# Altium schematic symbol library jlcpcb_2025_04_inductors_extended_0603.schlib: 1269 symbols (part 2 of 7)
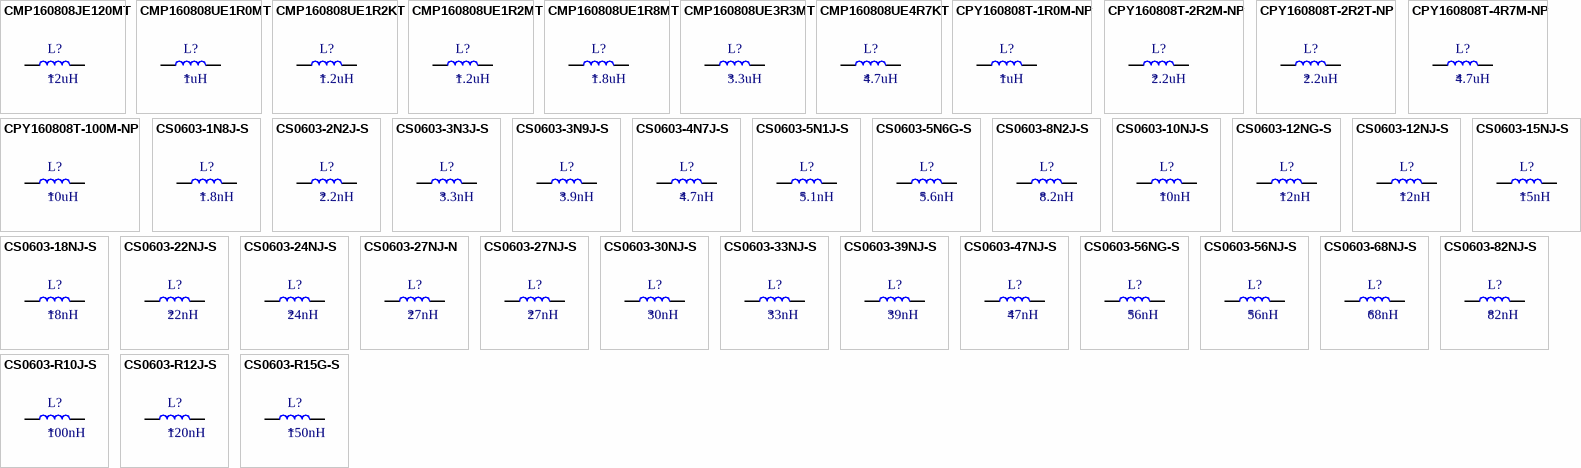
[diagram p32: symbols CMP160808JE120MT to CS0603-R15G-S]

## CS0603-33NJ-S
designator L?  Inductance: 33nH
Inductor, 33nH, ±5%, 220mΩ, 600mA, SMD 0603; Manufacturer: Chilisin Elec; Manufacturer Part Number: CS0603-33NJ-S; Self-Resonant Frequency: 2.3GHz; Q Factor: 40@250MHz; Package Size: 0603; JLCPCB Basic Part: No; JLCPCB Part Number: C280270; Supplier 1: LCSC; Category: Inductors; Supplier Part Number 1: C280270; Tolerance: ±5%; Rated Current: 600mA; DC Resistance: 220mΩ; RoHS: Yes; ComponentLink1Description: Datasheet; ComponentLink1URL: https://wmsc.lcsc.com/wmsc/upload/file/pdf/v2/lcsc/2304140030_Chilisin-Elec-CS0603-33NJ-S_C280270.pdf; ComponentLink2Description: JLCPCB Part URL; ComponentLink2URL: https://jlcpcb.com/partdetail/C280270; ComponentLink3Description: LCSC Part URL; ComponentLink3URL: https://lcsc.com/product-detail/Inductors-SMD_Chilisin-Elec-Chilisin-Elec-CS0603-33NJ-S_C280270.html
footprint IND-0603 (0603 (1608M) Inductor)
pins: 1, 2

## CS0603-39NJ-S
designator L?  Inductance: 39nH
Inductor, 39nH, ±5%, 250mΩ, 600mA, SMD 0603; Manufacturer: Chilisin Elec; Manufacturer Part Number: CS0603-39NJ-S; Self-Resonant Frequency: 2.2GHz; Q Factor: 40@250MHz; Package Size: 0603; JLCPCB Basic Part: No; JLCPCB Part Number: C142171; Supplier 1: LCSC; Category: Inductors; Supplier Part Number 1: C142171; Tolerance: ±5%; Rated Current: 600mA; DC Resistance: 250mΩ; RoHS: Yes; ComponentLink1Description: Datasheet; ComponentLink1URL: https://wmsc.lcsc.com/wmsc/upload/file/pdf/v2/lcsc/2304140030_Chilisin-Elec-CS0603-39NJ-S_C142171.pdf; ComponentLink2Description: JLCPCB Part URL; ComponentLink2URL: https://jlcpcb.com/partdetail/C142171; ComponentLink3Description: LCSC Part URL; ComponentLink3URL: https://lcsc.com/product-detail/Inductors-SMD_Chilisin-Elec-Chilisin-Elec-CS0603-39NJ-S_C142171.html
footprint IND-0603 (0603 (1608M) Inductor)
pins: 1, 2

## CS0603-47NJ-S
designator L?  Inductance: 47nH
Inductor, 47nH, ±5%, 280mΩ, 600mA, SMD 0603; Manufacturer: Chilisin Elec; Manufacturer Part Number: CS0603-47NJ-S; Self-Resonant Frequency: 2GHz; Q Factor: 38@200MHz; Package Size: 0603; JLCPCB Basic Part: No; JLCPCB Part Number: C280273; Supplier 1: LCSC; Category: Inductors; Supplier Part Number 1: C280273; Tolerance: ±5%; Rated Current: 600mA; DC Resistance: 280mΩ; RoHS: Yes; ComponentLink1Description: Datasheet; ComponentLink1URL: https://wmsc.lcsc.com/wmsc/upload/file/pdf/v2/lcsc/2304140030_Chilisin-Elec-CS0603-47NJ-S_C280273.pdf; ComponentLink2Description: JLCPCB Part URL; ComponentLink2URL: https://jlcpcb.com/partdetail/C280273; ComponentLink3Description: LCSC Part URL; ComponentLink3URL: https://lcsc.com/product-detail/Inductors-SMD_Chilisin-Elec-Chilisin-Elec-CS0603-47NJ-S_C280273.html
footprint IND-0603 (0603 (1608M) Inductor)
pins: 1, 2

## CS0603-56NG-S
designator L?  Inductance: 56nH
Inductor, 56nH, ±2%, 310mΩ, 600mA, SMD 0603; Manufacturer: Chilisin Elec; Manufacturer Part Number: CS0603-56NG-S; Self-Resonant Frequency: 1.9GHz; Q Factor: 38@200MHz; Package Size: 0603; JLCPCB Basic Part: No; JLCPCB Part Number: C280275; Supplier 1: LCSC; Category: Inductors; Supplier Part Number 1: C280275; Tolerance: ±2%; Rated Current: 600mA; DC Resistance: 310mΩ; RoHS: Yes; ComponentLink1Description: Datasheet; ComponentLink1URL: https://wmsc.lcsc.com/wmsc/upload/file/pdf/v2/lcsc/1810262121_Chilisin-Elec-CS0603-56NG-S_C280275.pdf; ComponentLink2Description: JLCPCB Part URL; ComponentLink2URL: https://jlcpcb.com/partdetail/C280275; ComponentLink3Description: LCSC Part URL; ComponentLink3URL: https://lcsc.com/product-detail/Inductors-SMD_Chilisin-Elec-Chilisin-Elec-CS0603-56NG-S_C280275.html
footprint IND-0603 (0603 (1608M) Inductor)
pins: 1, 2

## CS0603-56NJ-S
designator L?  Inductance: 56nH
Inductor, 56nH, ±5%, 310mΩ, 600mA, SMD 0603; Manufacturer: Chilisin Elec; Manufacturer Part Number: CS0603-56NJ-S; Self-Resonant Frequency: 1.9GHz; Q Factor: 38@200MHz; Package Size: 0603; JLCPCB Basic Part: No; JLCPCB Part Number: C108266; Supplier 1: LCSC; Category: Inductors; Supplier Part Number 1: C108266; Tolerance: ±5%; Rated Current: 600mA; DC Resistance: 310mΩ; RoHS: Yes; ComponentLink1Description: Datasheet; ComponentLink1URL: https://wmsc.lcsc.com/wmsc/upload/file/pdf/v2/lcsc/2304140030_Chilisin-Elec-CS0603-56NJ-S_C108266.pdf; ComponentLink2Description: JLCPCB Part URL; ComponentLink2URL: https://jlcpcb.com/partdetail/C108266; ComponentLink3Description: LCSC Part URL; ComponentLink3URL: https://lcsc.com/product-detail/Inductors-SMD_Chilisin-Elec-Chilisin-Elec-CS0603-56NJ-S_C108266.html
footprint IND-0603 (0603 (1608M) Inductor)
pins: 1, 2

## CS0603-68NJ-S
designator L?  Inductance: 68nH
Inductor, 68nH, ±5%, 340mΩ, 600mA, SMD 0603; Manufacturer: Chilisin Elec; Manufacturer Part Number: CS0603-68NJ-S; Self-Resonant Frequency: 1.7GHz; Q Factor: 37@200MHz; Package Size: 0603; JLCPCB Basic Part: No; JLCPCB Part Number: C142169; Supplier 1: LCSC; Category: Inductors; Supplier Part Number 1: C142169; Tolerance: ±5%; Rated Current: 600mA; DC Resistance: 340mΩ; RoHS: Yes; ComponentLink1Description: Datasheet; ComponentLink1URL: https://wmsc.lcsc.com/wmsc/upload/file/pdf/v2/lcsc/2304140030_Chilisin-Elec-CS0603-68NJ-S_C142169.pdf; ComponentLink2Description: JLCPCB Part URL; ComponentLink2URL: https://jlcpcb.com/partdetail/C142169; ComponentLink3Description: LCSC Part URL; ComponentLink3URL: https://lcsc.com/product-detail/Inductors-SMD_Chilisin-Elec-Chilisin-Elec-CS0603-68NJ-S_C142169.html
footprint IND-0603 (0603 (1608M) Inductor)
pins: 1, 2

## CS0603-82NJ-S
designator L?  Inductance: 82nH
Inductor, 82nH, ±5%, 540mΩ, 400mA, SMD 0603; Manufacturer: Chilisin Elec; Manufacturer Part Number: CS0603-82NJ-S; Self-Resonant Frequency: 1.7GHz; Q Factor: 34@150MHz; Package Size: 0603; JLCPCB Basic Part: No; JLCPCB Part Number: C280278; Supplier 1: LCSC; Category: Inductors; Supplier Part Number 1: C280278; Tolerance: ±5%; Rated Current: 400mA; DC Resistance: 540mΩ; RoHS: Yes; ComponentLink1Description: Datasheet; ComponentLink1URL: https://wmsc.lcsc.com/wmsc/upload/file/pdf/v2/lcsc/2304140030_Chilisin-Elec-CS0603-82NJ-S_C280278.pdf; ComponentLink2Description: JLCPCB Part URL; ComponentLink2URL: https://jlcpcb.com/partdetail/C280278; ComponentLink3Description: LCSC Part URL; ComponentLink3URL: https://lcsc.com/product-detail/Inductors-SMD_Chilisin-Elec-Chilisin-Elec-CS0603-82NJ-S_C280278.html
footprint IND-0603 (0603 (1608M) Inductor)
pins: 1, 2

## CS0603-R10J-S
designator L?  Inductance: 100nH
Inductor, 100nH, ±5%, 580mΩ, 400mA, SMD 0603; Manufacturer: Chilisin Elec; Manufacturer Part Number: CS0603-R10J-S; Self-Resonant Frequency: 1.4GHz; Q Factor: 34@150MHz; Package Size: 0603; JLCPCB Basic Part: No; JLCPCB Part Number: C142168; Supplier 1: LCSC; Category: Inductors; Supplier Part Number 1: C142168; Tolerance: ±5%; Rated Current: 400mA; DC Resistance: 580mΩ; RoHS: Yes; ComponentLink1Description: Datasheet; ComponentLink1URL: https://wmsc.lcsc.com/wmsc/upload/file/pdf/v2/lcsc/2304140030_Chilisin-Elec-CS0603-R10J-S_C142168.pdf; ComponentLink2Description: JLCPCB Part URL; ComponentLink2URL: https://jlcpcb.com/partdetail/C142168; ComponentLink3Description: LCSC Part URL; ComponentLink3URL: https://lcsc.com/product-detail/Inductors-SMD_Chilisin-Elec-Chilisin-Elec-CS0603-R10J-S_C142168.html
footprint IND-0603 (0603 (1608M) Inductor)
pins: 1, 2

## CS0603-R12J-S
designator L?  Inductance: 120nH
Inductor, 120nH, ±5%, 750mΩ, 300mA, SMD 0603; Manufacturer: Chilisin Elec; Manufacturer Part Number: CS0603-R12J-S; Self-Resonant Frequency: 1.3GHz; Q Factor: 32@150MHz; Package Size: 0603; JLCPCB Basic Part: No; JLCPCB Part Number: C280280; Supplier 1: LCSC; Category: Inductors; Supplier Part Number 1: C280280; Tolerance: ±5%; Rated Current: 300mA; DC Resistance: 750mΩ; RoHS: Yes; ComponentLink1Description: Datasheet; ComponentLink1URL: https://wmsc.lcsc.com/wmsc/upload/file/pdf/v2/lcsc/2304140030_Chilisin-Elec-CS0603-R12J-S_C280280.pdf; ComponentLink2Description: JLCPCB Part URL; ComponentLink2URL: https://jlcpcb.com/partdetail/C280280; ComponentLink3Description: LCSC Part URL; ComponentLink3URL: https://lcsc.com/product-detail/Inductors-SMD_Chilisin-Elec-Chilisin-Elec-CS0603-R12J-S_C280280.html
footprint IND-0603 (0603 (1608M) Inductor)
pins: 1, 2

## CS0603-R15G-S
designator L?  Inductance: 150nH
Inductor, 150nH, ±2%, 920mΩ, 280mA, SMD 0603; Manufacturer: Chilisin Elec; Manufacturer Part Number: CS0603-R15G-S; Self-Resonant Frequency: 990MHz; Q Factor: 28@150MHz; Package Size: 0603; JLCPCB Basic Part: No; JLCPCB Part Number: C280281; Supplier 1: LCSC; Category: Inductors; Supplier Part Number 1: C280281; Tolerance: ±2%; Rated Current: 280mA; DC Resistance: 920mΩ; RoHS: Yes; ComponentLink1Description: Datasheet; ComponentLink1URL: https://wmsc.lcsc.com/wmsc/upload/file/pdf/v2/lcsc/1810262121_Chilisin-Elec-CS0603-R15G-S_C280281.pdf; ComponentLink2Description: JLCPCB Part URL; ComponentLink2URL: https://jlcpcb.com/partdetail/C280281; ComponentLink3Description: LCSC Part URL; ComponentLink3URL: https://lcsc.com/product-detail/Inductors-SMD_Chilisin-Elec-Chilisin-Elec-CS0603-R15G-S_C280281.html
footprint IND-0603 (0603 (1608M) Inductor)
pins: 1, 2

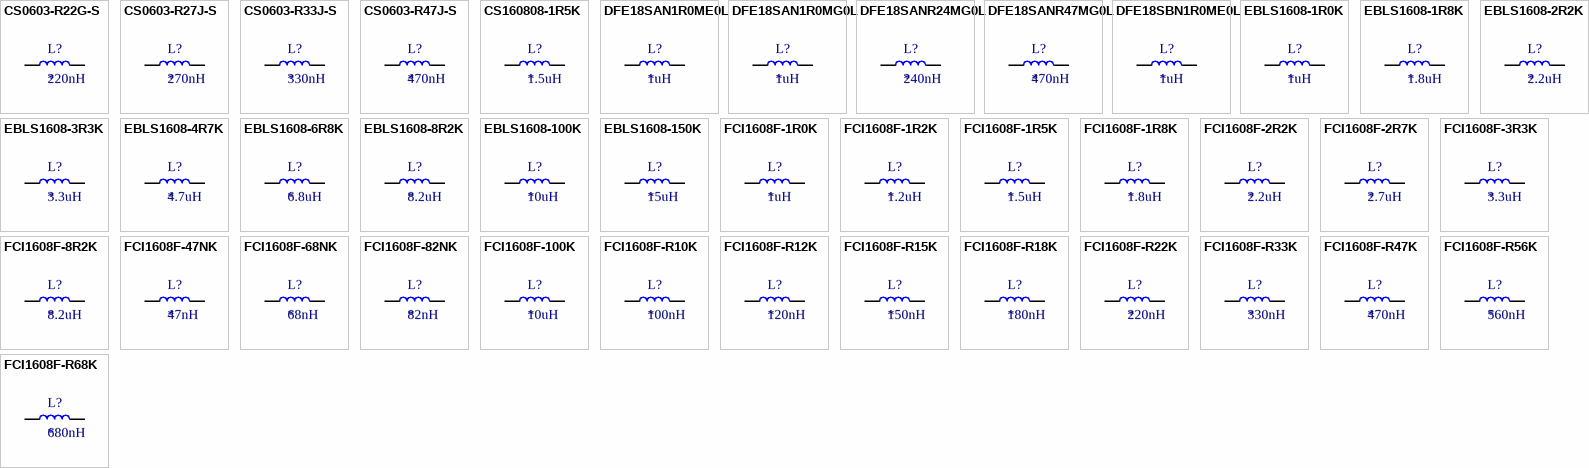
[diagram p5: symbols CS0603-R22G-S to FCI1608F-R68K]

## CS0603-R22G-S
designator L?  Inductance: 220nH
Inductor, 220nH, ±2%, 2.1Ω, 200mA, SMD 0603; Manufacturer: Chilisin Elec; Manufacturer Part Number: CS0603-R22G-S; Self-Resonant Frequency: 900MHz; Q Factor: 25@100MHz; Package Size: 0603; JLCPCB Basic Part: No; JLCPCB Part Number: C280284; Supplier 1: LCSC; Category: Inductors; Supplier Part Number 1: C280284; Tolerance: ±2%; Rated Current: 200mA; DC Resistance: 2.1Ω; RoHS: Yes; ComponentLink1Description: Datasheet; ComponentLink1URL: https://wmsc.lcsc.com/wmsc/upload/file/pdf/v2/lcsc/1810262121_Chilisin-Elec-CS0603-R22G-S_C280284.pdf; ComponentLink2Description: JLCPCB Part URL; ComponentLink2URL: https://jlcpcb.com/partdetail/C280284; ComponentLink3Description: LCSC Part URL; ComponentLink3URL: https://lcsc.com/product-detail/Inductors-SMD_Chilisin-Elec-Chilisin-Elec-CS0603-R22G-S_C280284.html
footprint IND-0603 (0603 (1608M) Inductor)
pins: 1, 2

## CS0603-R27J-S
designator L?  Inductance: 270nH
Inductor, 270nH, ±5%, 2.8Ω, 170mA, SMD 0603; Manufacturer: Chilisin Elec; Manufacturer Part Number: CS0603-R27J-S; Self-Resonant Frequency: 900MHz; Q Factor: 24@100MHz; Package Size: 0603; JLCPCB Basic Part: No; JLCPCB Part Number: C142166; Supplier 1: LCSC; Category: Inductors; Supplier Part Number 1: C142166; Tolerance: ±5%; Rated Current: 170mA; DC Resistance: 2.8Ω; RoHS: Yes; ComponentLink1Description: Datasheet; ComponentLink1URL: https://wmsc.lcsc.com/wmsc/upload/file/pdf/v2/lcsc/2304140030_Chilisin-Elec-CS0603-R27J-S_C142166.pdf; ComponentLink2Description: JLCPCB Part URL; ComponentLink2URL: https://jlcpcb.com/partdetail/C142166; ComponentLink3Description: LCSC Part URL; ComponentLink3URL: https://lcsc.com/product-detail/Inductors-SMD_Chilisin-Elec-Chilisin-Elec-CS0603-R27J-S_C142166.html
footprint IND-0603 (0603 (1608M) Inductor)
pins: 1, 2

## CS0603-R33J-S
designator L?  Inductance: 330nH
Inductor, 330nH, ±5%, 3.89Ω, 100mA, SMD 0603; Manufacturer: Chilisin Elec; Manufacturer Part Number: CS0603-R33J-S; Self-Resonant Frequency: 900MHz; Q Factor: 25@100MHz; Package Size: 0603; JLCPCB Basic Part: No; JLCPCB Part Number: C142165; Supplier 1: LCSC; Category: Inductors; Supplier Part Number 1: C142165; Tolerance: ±5%; Rated Current: 100mA; DC Resistance: 3.89Ω; RoHS: Yes; ComponentLink1Description: Datasheet; ComponentLink1URL: https://wmsc.lcsc.com/wmsc/upload/file/pdf/v2/lcsc/2304140030_Chilisin-Elec-CS0603-R33J-S_C142165.pdf; ComponentLink2Description: JLCPCB Part URL; ComponentLink2URL: https://jlcpcb.com/partdetail/C142165; ComponentLink3Description: LCSC Part URL; ComponentLink3URL: https://lcsc.com/product-detail/Inductors-SMD_Chilisin-Elec-Chilisin-Elec-CS0603-R33J-S_C142165.html
footprint IND-0603 (0603 (1608M) Inductor)
pins: 1, 2

## CS0603-R47J-S
designator L?  Inductance: 470nH
Inductor, 470nH, ±5%, 4.5Ω, 100mA, SMD 0603; Manufacturer: Chilisin Elec; Manufacturer Part Number: CS0603-R47J-S; Self-Resonant Frequency: 500MHz; Q Factor: 25@100MHz; Package Size: 0603; JLCPCB Basic Part: No; JLCPCB Part Number: C280285; Supplier 1: LCSC; Category: Inductors; Supplier Part Number 1: C280285; Tolerance: ±5%; Rated Current: 100mA; DC Resistance: 4.5Ω; RoHS: Yes; ComponentLink1Description: Datasheet; ComponentLink1URL: https://wmsc.lcsc.com/wmsc/upload/file/pdf/v2/lcsc/2304140030_Chilisin-Elec-CS0603-R47J-S_C280285.pdf; ComponentLink2Description: JLCPCB Part URL; ComponentLink2URL: https://jlcpcb.com/partdetail/C280285; ComponentLink3Description: LCSC Part URL; ComponentLink3URL: https://lcsc.com/product-detail/Inductors-SMD_Chilisin-Elec-Chilisin-Elec-CS0603-R47J-S_C280285.html
footprint IND-0603 (0603 (1608M) Inductor)
pins: 1, 2

## CS160808-1R5K
designator L?  Inductance: 1.5uH
Inductor, 1.5uH, ±10%, 650mΩ, 50mA, SMD 0603; Manufacturer: BOURNS; Manufacturer Part Number: CS160808-1R5K; Self-Resonant Frequency: 55MHz; Q Factor: 50@10MHz; Package Size: 0603; JLCPCB Basic Part: No; JLCPCB Part Number: C2052402; Supplier 1: LCSC; Category: Inductors; Supplier Part Number 1: C2052402; Tolerance: ±10%; Rated Current: 50mA; DC Resistance: 650mΩ; RoHS: Yes; ComponentLink1Description: Datasheet; ComponentLink1URL: https://wmsc.lcsc.com/wmsc/upload/file/pdf/v2/lcsc/2202010700_BOURNS-CS160808-1R5K_C2052402.pdf; ComponentLink2Description: JLCPCB Part URL; ComponentLink2URL: https://jlcpcb.com/partdetail/C2052402; ComponentLink3Description: LCSC Part URL; ComponentLink3URL: https://lcsc.com/product-detail/Inductors-SMD_BOURNS-BOURNS-CS160808-1R5K_C2052402.html
footprint IND-0603 (0603 (1608M) Inductor)
pins: 1, 2

## DFE18SAN1R0ME0L
designator L?  Inductance: 1uH
Inductor, 1uH, ±20%, 144mΩ, 1.6A, SMD 0603; Manufacturer: Murata Electronics; Manufacturer Part Number: DFE18SAN1R0ME0L; Package Size: 0603; JLCPCB Basic Part: No; JLCPCB Part Number: C2044564; Supplier 1: LCSC; Category: Inductors; Supplier Part Number 1: C2044564; Tolerance: ±20%; Rated Current: 1.6A; DC Resistance: 144mΩ; RoHS: Yes; ComponentLink1Description: Datasheet; ComponentLink1URL: https://wmsc.lcsc.com/wmsc/upload/file/pdf/v2/lcsc/2304140030_Murata-Electronics-DFE18SAN1R0ME0L_C2044564.pdf; ComponentLink2Description: JLCPCB Part URL; ComponentLink2URL: https://jlcpcb.com/partdetail/C2044564; ComponentLink3Description: LCSC Part URL; ComponentLink3URL: https://lcsc.com/product-detail/Inductors-SMD_Murata-Electronics-Murata-Electronics-DFE18SAN1R0ME0L_C2044564.html
footprint IND-0603 (0603 (1608M) Inductor)
pins: 1, 2

## DFE18SAN1R0MG0L
designator L?  Inductance: 1uH
Inductor, 1uH, ±20%, 128mΩ, 1.7A, SMD 0603; Manufacturer: Murata Electronics; Manufacturer Part Number: DFE18SAN1R0MG0L; Saturation Current: 2.1A; Package Size: 0603; JLCPCB Basic Part: No; JLCPCB Part Number: C560043; Supplier 1: LCSC; Category: Inductors; Supplier Part Number 1: C560043; Tolerance: ±20%; Rated Current: 1.7A; DC Resistance: 128mΩ; RoHS: Yes; ComponentLink1Description: Datasheet; ComponentLink1URL: https://wmsc.lcsc.com/wmsc/upload/file/pdf/v2/lcsc/2304140030_Murata-Electronics-DFE18SAN1R0MG0L_C560043.pdf; ComponentLink2Description: JLCPCB Part URL; ComponentLink2URL: https://jlcpcb.com/partdetail/C560043; ComponentLink3Description: LCSC Part URL; ComponentLink3URL: https://lcsc.com/product-detail/Inductors-SMD_Murata-Electronics-Murata-Electronics-DFE18SAN1R0MG0L_C560043.html
footprint IND-0603 (0603 (1608M) Inductor)
pins: 1, 2

## DFE18SANR24MG0L
designator L?  Inductance: 240nH
Inductor, 240nH, ±20%, 30mΩ, 3.5A, SMD 0603; Manufacturer: Murata Electronics; Manufacturer Part Number: DFE18SANR24MG0L; Package Size: 0603; JLCPCB Basic Part: No; JLCPCB Part Number: C668512; Supplier 1: LCSC; Category: Inductors; Supplier Part Number 1: C668512; Tolerance: ±20%; Rated Current: 3.5A; DC Resistance: 30mΩ; RoHS: Yes; ComponentLink1Description: Datasheet; ComponentLink1URL: https://wmsc.lcsc.com/wmsc/upload/file/pdf/v2/lcsc/2007241808_Murata-Electronics-DFE18SANR24MG0L_C668512.pdf; ComponentLink2Description: JLCPCB Part URL; ComponentLink2URL: https://jlcpcb.com/partdetail/C668512; ComponentLink3Description: LCSC Part URL; ComponentLink3URL: https://lcsc.com/product-detail/Inductors-SMD_Murata-Electronics-Murata-Electronics-DFE18SANR24MG0L_C668512.html
footprint IND-0603 (0603 (1608M) Inductor)
pins: 1, 2

## DFE18SANR47MG0L
designator L?  Inductance: 470nH
Inductor, 470nH, ±20%, 54mΩ, 2.6A, SMD 0603; Manufacturer: Murata Electronics; Manufacturer Part Number: DFE18SANR47MG0L; Package Size: 0603; JLCPCB Basic Part: No; JLCPCB Part Number: C882988; Supplier 1: LCSC; Category: Inductors; Supplier Part Number 1: C882988; Tolerance: ±20%; Rated Current: 2.6A; DC Resistance: 54mΩ; RoHS: Yes; ComponentLink1Description: Datasheet; ComponentLink1URL: https://wmsc.lcsc.com/wmsc/upload/file/pdf/v2/lcsc/2201242130_Murata-Electronics-DFE18SANR47MG0L_C882988.pdf; ComponentLink2Description: JLCPCB Part URL; ComponentLink2URL: https://jlcpcb.com/partdetail/C882988; ComponentLink3Description: LCSC Part URL; ComponentLink3URL: https://lcsc.com/product-detail/Inductors-SMD_Murata-Electronics-Murata-Electronics-DFE18SANR47MG0L_C882988.html
footprint IND-0603 (0603 (1608M) Inductor)
pins: 1, 2

## DFE18SBN1R0ME0L
designator L?  Inductance: 1uH
Inductor, 1uH, ±20%, 120mΩ, 1.8A, SMD 0603; Manufacturer: Murata Electronics; Manufacturer Part Number: DFE18SBN1R0ME0L; Saturation Current: 1.9A; Package Size: 0603; JLCPCB Basic Part: No; JLCPCB Part Number: C882989; Supplier 1: LCSC; Category: Inductors; Supplier Part Number 1: C882989; Tolerance: ±20%; Rated Current: 1.8A; DC Resistance: 120mΩ; RoHS: Yes; ComponentLink1Description: Datasheet; ComponentLink1URL: https://wmsc.lcsc.com/wmsc/upload/file/pdf/v2/lcsc/2011111205_Murata-Electronics-DFE18SBN1R0ME0L_C882989.pdf; ComponentLink2Description: JLCPCB Part URL; ComponentLink2URL: https://jlcpcb.com/partdetail/C882989; ComponentLink3Description: LCSC Part URL; ComponentLink3URL: https://lcsc.com/product-detail/Power-Inductors_Murata-Electronics-Murata-Electronics-DFE18SBN1R0ME0L_C882989.html
footprint IND-0603 (0603 (1608M) Inductor)
pins: 1, 2

## EBLS1608-1R0K
designator L?  Inductance: 1uH
Inductor, 1uH, ±10%, 600mΩ, 25mA, SMD 0603; Manufacturer: HYHONGYEX; Manufacturer Part Number: EBLS1608-1R0K; Self-Resonant Frequency: 75MHz; Q Factor: 35@10MHz; Package Size: 0603; JLCPCB Basic Part: No; JLCPCB Part Number: C963789; Supplier 1: LCSC; Category: Inductors; Supplier Part Number 1: C963789; Tolerance: ±10%; Rated Current: 25mA; DC Resistance: 600mΩ; RoHS: Yes; ComponentLink1Description: Datasheet; ComponentLink1URL: https://wmsc.lcsc.com/wmsc/upload/file/pdf/v2/lcsc/2305191017_HYHONGYEX-EBLS1608-1R0K_C963789.pdf; ComponentLink2Description: JLCPCB Part URL; ComponentLink2URL: https://jlcpcb.com/partdetail/C963789; ComponentLink3Description: LCSC Part URL; ComponentLink3URL: https://lcsc.com/product-detail/Inductors-SMD_HYHONGYEX-HYHONGYEX-EBLS1608-1R0K_C963789.html
footprint IND-0603 (0603 (1608M) Inductor)
pins: 1, 2

## EBLS1608-1R8K
designator L?  Inductance: 1.8uH
Inductor, 1.8uH, ±10%, 0.95Ω, 25mA, SMD 0603; Manufacturer: HYHONGYEX; Manufacturer Part Number: EBLS1608-1R8K; Self-Resonant Frequency: 55MHz; Q Factor: 35@10MHz; Package Size: 0603; JLCPCB Basic Part: No; JLCPCB Part Number: C963790; Supplier 1: LCSC; Category: Inductors; Supplier Part Number 1: C963790; Tolerance: ±10%; Rated Current: 25mA; DC Resistance: 0.95Ω; RoHS: Yes; ComponentLink1Description: Datasheet; ComponentLink1URL: https://wmsc.lcsc.com/wmsc/upload/file/pdf/v2/lcsc/2305190958_HYHONGYEX-EBLS1608-1R8K_C963790.pdf; ComponentLink2Description: JLCPCB Part URL; ComponentLink2URL: https://jlcpcb.com/partdetail/C963790; ComponentLink3Description: LCSC Part URL; ComponentLink3URL: https://lcsc.com/product-detail/Inductors-SMD_HYHONGYEX-HYHONGYEX-EBLS1608-1R8K_C963790.html
footprint IND-0603 (0603 (1608M) Inductor)
pins: 1, 2

## EBLS1608-2R2K
designator L?  Inductance: 2.2uH
Inductor, 2.2uH, ±10%, 1.15Ω, 15mA, SMD 0603; Manufacturer: HYHONGYEX; Manufacturer Part Number: EBLS1608-2R2K; Self-Resonant Frequency: 50MHz; Q Factor: 35@10MHz; Package Size: 0603; JLCPCB Basic Part: No; JLCPCB Part Number: C963791; Supplier 1: LCSC; Category: Inductors; Supplier Part Number 1: C963791; Tolerance: ±10%; Rated Current: 15mA; DC Resistance: 1.15Ω; RoHS: Yes; ComponentLink1Description: Datasheet; ComponentLink1URL: https://wmsc.lcsc.com/wmsc/upload/file/pdf/v2/lcsc/2305190958_HYHONGYEX-EBLS1608-2R2K_C963791.pdf; ComponentLink2Description: JLCPCB Part URL; ComponentLink2URL: https://jlcpcb.com/partdetail/C963791; ComponentLink3Description: LCSC Part URL; ComponentLink3URL: https://lcsc.com/product-detail/Inductors-SMD_HYHONGYEX-HYHONGYEX-EBLS1608-2R2K_C963791.html
footprint IND-0603 (0603 (1608M) Inductor)
pins: 1, 2

## EBLS1608-3R3K
designator L?  Inductance: 3.3uH
Inductor, 3.3uH, ±10%, 1.55Ω, 15mA, SMD 0603; Manufacturer: HYHONGYEX; Manufacturer Part Number: EBLS1608-3R3K; Self-Resonant Frequency: 40MHz; Q Factor: 35@10MHz; Package Size: 0603; JLCPCB Basic Part: No; JLCPCB Part Number: C963792; Supplier 1: LCSC; Category: Inductors; Supplier Part Number 1: C963792; Tolerance: ±10%; Rated Current: 15mA; DC Resistance: 1.55Ω; RoHS: Yes; ComponentLink1Description: Datasheet; ComponentLink1URL: https://wmsc.lcsc.com/wmsc/upload/file/pdf/v2/lcsc/2305191017_HYHONGYEX-EBLS1608-3R3K_C963792.pdf; ComponentLink2Description: JLCPCB Part URL; ComponentLink2URL: https://jlcpcb.com/partdetail/C963792; ComponentLink3Description: LCSC Part URL; ComponentLink3URL: https://lcsc.com/product-detail/Inductors-SMD_HYHONGYEX-HYHONGYEX-EBLS1608-3R3K_C963792.html
footprint IND-0603 (0603 (1608M) Inductor)
pins: 1, 2

## EBLS1608-4R7K
designator L?  Inductance: 4.7uH
Inductor, 4.7uH, ±10%, 2.1Ω, 15mA, SMD 0603; Manufacturer: HYHONGYEX; Manufacturer Part Number: EBLS1608-4R7K; Self-Resonant Frequency: 33MHz; Q Factor: 35@10MHz; Package Size: 0603; JLCPCB Basic Part: No; JLCPCB Part Number: C963793; Supplier 1: LCSC; Category: Inductors; Supplier Part Number 1: C963793; Tolerance: ±10%; Rated Current: 15mA; DC Resistance: 2.1Ω; RoHS: Yes; ComponentLink1Description: Datasheet; ComponentLink1URL: https://wmsc.lcsc.com/wmsc/upload/file/pdf/v2/lcsc/2305190958_HYHONGYEX-EBLS1608-4R7K_C963793.pdf; ComponentLink2Description: JLCPCB Part URL; ComponentLink2URL: https://jlcpcb.com/partdetail/C963793; ComponentLink3Description: LCSC Part URL; ComponentLink3URL: https://lcsc.com/product-detail/Inductors-SMD_HYHONGYEX-HYHONGYEX-EBLS1608-4R7K_C963793.html
footprint IND-0603 (0603 (1608M) Inductor)
pins: 1, 2

## EBLS1608-6R8K
designator L?  Inductance: 6.8uH
Inductor, 6.8uH, ±10%, 1.7Ω, 5mA, SMD 0603; Manufacturer: HYHONGYEX; Manufacturer Part Number: EBLS1608-6R8K; Self-Resonant Frequency: 20MHz; Q Factor: 35@4MHz; Package Size: 0603; JLCPCB Basic Part: No; JLCPCB Part Number: C963795; Supplier 1: LCSC; Category: Inductors; Supplier Part Number 1: C963795; Tolerance: ±10%; Rated Current: 5mA; DC Resistance: 1.7Ω; RoHS: Yes; ComponentLink1Description: Datasheet; ComponentLink1URL: https://wmsc.lcsc.com/wmsc/upload/file/pdf/v2/lcsc/2305190958_HYHONGYEX-EBLS1608-6R8K_C963795.pdf; ComponentLink2Description: JLCPCB Part URL; ComponentLink2URL: https://jlcpcb.com/partdetail/C963795; ComponentLink3Description: LCSC Part URL; ComponentLink3URL: https://lcsc.com/product-detail/Inductors-SMD_HYHONGYEX-HYHONGYEX-EBLS1608-6R8K_C963795.html
footprint IND-0603 (0603 (1608M) Inductor)
pins: 1, 2

## EBLS1608-8R2K
designator L?  Inductance: 8.2uH
Inductor, 8.2uH, ±10%, 2.1Ω, 5mA, SMD 0603; Manufacturer: HYHONGYEX; Manufacturer Part Number: EBLS1608-8R2K; Self-Resonant Frequency: 18MHz; Q Factor: 35@4MHz; Package Size: 0603; JLCPCB Basic Part: No; JLCPCB Part Number: C963796; Supplier 1: LCSC; Category: Inductors; Supplier Part Number 1: C963796; Tolerance: ±10%; Rated Current: 5mA; DC Resistance: 2.1Ω; RoHS: Yes; ComponentLink1Description: Datasheet; ComponentLink1URL: https://wmsc.lcsc.com/wmsc/upload/file/pdf/v2/lcsc/2305190958_HYHONGYEX-EBLS1608-8R2K_C963796.pdf; ComponentLink2Description: JLCPCB Part URL; ComponentLink2URL: https://jlcpcb.com/partdetail/C963796; ComponentLink3Description: LCSC Part URL; ComponentLink3URL: https://lcsc.com/product-detail/Inductors-SMD_HYHONGYEX-HYHONGYEX-EBLS1608-8R2K_C963796.html
footprint IND-0603 (0603 (1608M) Inductor)
pins: 1, 2

## EBLS1608-100K
designator L?  Inductance: 10uH
Inductor, 10uH, ±10%, 1.85Ω, 3mA, SMD 0603; Manufacturer: HYHONGYEX; Manufacturer Part Number: EBLS1608-100K; Self-Resonant Frequency: 17MHz; Q Factor: 30@2MHz; Package Size: 0603; JLCPCB Basic Part: No; JLCPCB Part Number: C963797; Supplier 1: LCSC; Category: Inductors; Supplier Part Number 1: C963797; Tolerance: ±10%; Rated Current: 3mA; DC Resistance: 1.85Ω; RoHS: Yes; ComponentLink1Description: Datasheet; ComponentLink1URL: https://wmsc.lcsc.com/wmsc/upload/file/pdf/v2/lcsc/2305190958_HYHONGYEX-EBLS1608-100K_C963797.pdf; ComponentLink2Description: JLCPCB Part URL; ComponentLink2URL: https://jlcpcb.com/partdetail/C963797; ComponentLink3Description: LCSC Part URL; ComponentLink3URL: https://lcsc.com/product-detail/Inductors-SMD_HYHONGYEX-HYHONGYEX-EBLS1608-100K_C963797.html
footprint IND-0603 (0603 (1608M) Inductor)
pins: 1, 2

## EBLS1608-150K
designator L?  Inductance: 15uH
Inductor, 15uH, ±10%, 1.7Ω, 1mA, SMD 0603; Manufacturer: HYHONGYEX; Manufacturer Part Number: EBLS1608-150K; Self-Resonant Frequency: 14MHz; Q Factor: 20@1MHz; Package Size: 0603; JLCPCB Basic Part: No; JLCPCB Part Number: C963799; Supplier 1: LCSC; Category: Inductors; Supplier Part Number 1: C963799; Tolerance: ±10%; Rated Current: 1mA; DC Resistance: 1.7Ω; RoHS: Yes; ComponentLink1Description: Datasheet; ComponentLink1URL: https://wmsc.lcsc.com/wmsc/upload/file/pdf/v2/lcsc/2305190958_HYHONGYEX-EBLS1608-150K_C963799.pdf; ComponentLink2Description: JLCPCB Part URL; ComponentLink2URL: https://jlcpcb.com/partdetail/C963799; ComponentLink3Description: LCSC Part URL; ComponentLink3URL: https://lcsc.com/product-detail/Inductors-SMD_HYHONGYEX-HYHONGYEX-EBLS1608-150K_C963799.html
footprint IND-0603 (0603 (1608M) Inductor)
pins: 1, 2

## FCI1608F-1R0K
designator L?  Inductance: 1uH
Inductor, 1uH, ±10%, 600mΩ, 25mA, SMD 0603; Manufacturer: TAI-TECH; Manufacturer Part Number: FCI1608F-1R0K; Package Size: 0603; JLCPCB Basic Part: No; JLCPCB Part Number: C127300; Supplier 1: LCSC; Category: Inductors; Supplier Part Number 1: C127300; Tolerance: ±10%; Rated Current: 25mA; DC Resistance: 600mΩ; RoHS: Yes; ComponentLink1Description: Datasheet; ComponentLink1URL: https://wmsc.lcsc.com/wmsc/upload/file/pdf/v2/lcsc/2009171134_TAI-TECH-FCI1608F-1R0K_C127300.pdf; ComponentLink2Description: JLCPCB Part URL; ComponentLink2URL: https://jlcpcb.com/partdetail/C127300; ComponentLink3Description: LCSC Part URL; ComponentLink3URL: https://lcsc.com/product-detail/Inductors-SMD_TAI-TECH-TAI-TECH-FCI1608F-1R0K_C127300.html
footprint IND-0603 (0603 (1608M) Inductor)
pins: 1, 2

## FCI1608F-1R2K
designator L?  Inductance: 1.2uH
Inductor, 1.2uH, ±10%, 800mΩ, 25mA, SMD 0603; Manufacturer: TAI-TECH; Manufacturer Part Number: FCI1608F-1R2K; Package Size: 0603; JLCPCB Basic Part: No; JLCPCB Part Number: C356918; Supplier 1: LCSC; Category: Inductors; Supplier Part Number 1: C356918; Tolerance: ±10%; Rated Current: 25mA; DC Resistance: 800mΩ; RoHS: Yes; ComponentLink1Description: Datasheet; ComponentLink1URL: https://wmsc.lcsc.com/wmsc/upload/file/pdf/v2/lcsc/2009171137_TAI-TECH-FCI1608F-1R2K_C356918.pdf; ComponentLink2Description: JLCPCB Part URL; ComponentLink2URL: https://jlcpcb.com/partdetail/C356918; ComponentLink3Description: LCSC Part URL; ComponentLink3URL: https://lcsc.com/product-detail/Inductors-SMD_TAI-TECH-TAI-TECH-FCI1608F-1R2K_C356918.html
footprint IND-0603 (0603 (1608M) Inductor)
pins: 1, 2

## FCI1608F-1R5K
designator L?  Inductance: 1.5uH
Inductor, 1.5uH, ±10%, 800mΩ, 25mA, SMD 0603; Manufacturer: TAI-TECH; Manufacturer Part Number: FCI1608F-1R5K; Package Size: 0603; JLCPCB Basic Part: No; JLCPCB Part Number: C155000; Supplier 1: LCSC; Category: Inductors; Supplier Part Number 1: C155000; Tolerance: ±10%; Rated Current: 25mA; DC Resistance: 800mΩ; RoHS: Yes; ComponentLink1Description: Datasheet; ComponentLink1URL: https://wmsc.lcsc.com/wmsc/upload/file/pdf/v2/lcsc/2009171305_TAI-TECH-FCI1608F-1R5K_C155000.pdf; ComponentLink2Description: JLCPCB Part URL; ComponentLink2URL: https://jlcpcb.com/partdetail/C155000; ComponentLink3Description: LCSC Part URL; ComponentLink3URL: https://lcsc.com/product-detail/Inductors-SMD_TAI-TECH-TAI-TECH-FCI1608F-1R5K_C155000.html
footprint IND-0603 (0603 (1608M) Inductor)
pins: 1, 2

## FCI1608F-1R8K
designator L?  Inductance: 1.8uH
Inductor, 1.8uH, ±10%, 950mΩ, 25mA, SMD 0603; Manufacturer: TAI-TECH; Manufacturer Part Number: FCI1608F-1R8K; Package Size: 0603; JLCPCB Basic Part: No; JLCPCB Part Number: C155001; Supplier 1: LCSC; Category: Inductors; Supplier Part Number 1: C155001; Tolerance: ±10%; Rated Current: 25mA; DC Resistance: 950mΩ; RoHS: Yes; ComponentLink1Description: Datasheet; ComponentLink1URL: https://wmsc.lcsc.com/wmsc/upload/file/pdf/v2/lcsc/2009171305_TAI-TECH-FCI1608F-1R8K_C155001.pdf; ComponentLink2Description: JLCPCB Part URL; ComponentLink2URL: https://jlcpcb.com/partdetail/C155001; ComponentLink3Description: LCSC Part URL; ComponentLink3URL: https://lcsc.com/product-detail/Inductors-SMD_TAI-TECH-TAI-TECH-FCI1608F-1R8K_C155001.html
footprint IND-0603 (0603 (1608M) Inductor)
pins: 1, 2

## FCI1608F-2R2K
designator L?  Inductance: 2.2uH
Inductor, 2.2uH, ±10%, 1.15Ω, 15mA, SMD 0603; Manufacturer: TAI-TECH; Manufacturer Part Number: FCI1608F-2R2K; Package Size: 0603; JLCPCB Basic Part: No; JLCPCB Part Number: C127308; Supplier 1: LCSC; Category: Inductors; Supplier Part Number 1: C127308; Tolerance: ±10%; Rated Current: 15mA; DC Resistance: 1.15Ω; RoHS: Yes; ComponentLink1Description: Datasheet; ComponentLink1URL: https://wmsc.lcsc.com/wmsc/upload/file/pdf/v2/lcsc/2009171134_TAI-TECH-FCI1608F-2R2K_C127308.pdf; ComponentLink2Description: JLCPCB Part URL; ComponentLink2URL: https://jlcpcb.com/partdetail/C127308; ComponentLink3Description: LCSC Part URL; ComponentLink3URL: https://lcsc.com/product-detail/Inductors-SMD_TAI-TECH-TAI-TECH-FCI1608F-2R2K_C127308.html
footprint IND-0603 (0603 (1608M) Inductor)
pins: 1, 2

## FCI1608F-2R7K
designator L?  Inductance: 2.7uH
Inductor, 2.7uH, ±10%, 1.35Ω, 15mA, SMD 0603; Manufacturer: TAI-TECH; Manufacturer Part Number: FCI1608F-2R7K; Package Size: 0603; JLCPCB Basic Part: No; JLCPCB Part Number: C356919; Supplier 1: LCSC; Category: Inductors; Supplier Part Number 1: C356919; Tolerance: ±10%; Rated Current: 15mA; DC Resistance: 1.35Ω; RoHS: Yes; ComponentLink1Description: Datasheet; ComponentLink1URL: https://wmsc.lcsc.com/wmsc/upload/file/pdf/v2/lcsc/2009171137_TAI-TECH-FCI1608F-2R7K_C356919.pdf; ComponentLink2Description: JLCPCB Part URL; ComponentLink2URL: https://jlcpcb.com/partdetail/C356919; ComponentLink3Description: LCSC Part URL; ComponentLink3URL: https://lcsc.com/product-detail/Inductors-SMD_TAI-TECH-TAI-TECH-FCI1608F-2R7K_C356919.html
footprint IND-0603 (0603 (1608M) Inductor)
pins: 1, 2

## FCI1608F-3R3K
designator L?  Inductance: 3.3uH
Inductor, 3.3uH, ±10%, 1.55Ω, 15mA, SMD 0603; Manufacturer: TAI-TECH; Manufacturer Part Number: FCI1608F-3R3K; Package Size: 0603; JLCPCB Basic Part: No; JLCPCB Part Number: C155002; Supplier 1: LCSC; Category: Inductors; Supplier Part Number 1: C155002; Tolerance: ±10%; Rated Current: 15mA; DC Resistance: 1.55Ω; RoHS: Yes; ComponentLink1Description: Datasheet; ComponentLink1URL: https://wmsc.lcsc.com/wmsc/upload/file/pdf/v2/lcsc/2009171305_TAI-TECH-FCI1608F-3R3K_C155002.pdf; ComponentLink2Description: JLCPCB Part URL; ComponentLink2URL: https://jlcpcb.com/partdetail/C155002; ComponentLink3Description: LCSC Part URL; ComponentLink3URL: https://lcsc.com/product-detail/Inductors-SMD_TAI-TECH-TAI-TECH-FCI1608F-3R3K_C155002.html
footprint IND-0603 (0603 (1608M) Inductor)
pins: 1, 2

## FCI1608F-8R2K
designator L?  Inductance: 8.2uH
Inductor, 8.2uH, ±10%, 300mΩ, 50mA, SMD 0603; Manufacturer: TAI-TECH; Manufacturer Part Number: FCI1608F-8R2K; Self-Resonant Frequency: 245MHz; Q Factor: 10@50MHz; Package Size: 0603; JLCPCB Basic Part: No; JLCPCB Part Number: C356921; Supplier 1: LCSC; Category: Inductors; Supplier Part Number 1: C356921; Tolerance: ±10%; Rated Current: 50mA; DC Resistance: 300mΩ; RoHS: Yes; ComponentLink1Description: Datasheet; ComponentLink1URL: https://wmsc.lcsc.com/wmsc/upload/file/pdf/v2/lcsc/2207131100_TAI-TECH-FCI1608F-8R2K_C356921.pdf; ComponentLink2Description: JLCPCB Part URL; ComponentLink2URL: https://jlcpcb.com/partdetail/C356921; ComponentLink3Description: LCSC Part URL; ComponentLink3URL: https://lcsc.com/product-detail/Inductors-SMD_TAI-TECH-TAI-TECH-FCI1608F-8R2K_C356921.html
footprint IND-0603 (0603 (1608M) Inductor)
pins: 1, 2

## FCI1608F-47NK
designator L?  Inductance: 47nH
Inductor, 47nH, ±10%, 300mΩ, 50mA, SMD 0603; Manufacturer: TAI-TECH; Manufacturer Part Number: FCI1608F-47NK; Package Size: 0603; JLCPCB Basic Part: No; JLCPCB Part Number: C155003; Supplier 1: LCSC; Category: Inductors; Supplier Part Number 1: C155003; Tolerance: ±10%; Rated Current: 50mA; DC Resistance: 300mΩ; RoHS: Yes; ComponentLink1Description: Datasheet; ComponentLink1URL: https://wmsc.lcsc.com/wmsc/upload/file/pdf/v2/lcsc/2009171305_TAI-TECH-FCI1608F-47NK_C155003.pdf; ComponentLink2Description: JLCPCB Part URL; ComponentLink2URL: https://jlcpcb.com/partdetail/C155003; ComponentLink3Description: LCSC Part URL; ComponentLink3URL: https://lcsc.com/product-detail/Inductors-SMD_TAI-TECH-TAI-TECH-FCI1608F-47NK_C155003.html
footprint IND-0603 (0603 (1608M) Inductor)
pins: 1, 2

## FCI1608F-68NK
designator L?  Inductance: 68nH
Inductor, 68nH, ±10%, 300mΩ, 50mA, SMD 0603; Manufacturer: TAI-TECH; Manufacturer Part Number: FCI1608F-68NK; Package Size: 0603; JLCPCB Basic Part: No; JLCPCB Part Number: C155005; Supplier 1: LCSC; Category: Inductors; Supplier Part Number 1: C155005; Tolerance: ±10%; Rated Current: 50mA; DC Resistance: 300mΩ; RoHS: Yes; ComponentLink1Description: Datasheet; ComponentLink1URL: https://wmsc.lcsc.com/wmsc/upload/file/pdf/v2/lcsc/2009171305_TAI-TECH-FCI1608F-68NK_C155005.pdf; ComponentLink2Description: JLCPCB Part URL; ComponentLink2URL: https://jlcpcb.com/partdetail/C155005; ComponentLink3Description: LCSC Part URL; ComponentLink3URL: https://lcsc.com/product-detail/Inductors-SMD_TAI-TECH-TAI-TECH-FCI1608F-68NK_C155005.html
footprint IND-0603 (0603 (1608M) Inductor)
pins: 1, 2

## FCI1608F-82NK
designator L?  Inductance: 82nH
Inductor, 82nH, ±10%, 300mΩ, 50mA, SMD 0603; Manufacturer: TAI-TECH; Manufacturer Part Number: FCI1608F-82NK; Package Size: 0603; JLCPCB Basic Part: No; JLCPCB Part Number: C155006; Supplier 1: LCSC; Category: Inductors; Supplier Part Number 1: C155006; Tolerance: ±10%; Rated Current: 50mA; DC Resistance: 300mΩ; RoHS: Yes; ComponentLink1Description: Datasheet; ComponentLink1URL: https://wmsc.lcsc.com/wmsc/upload/file/pdf/v2/lcsc/2009171305_TAI-TECH-FCI1608F-82NK_C155006.pdf; ComponentLink2Description: JLCPCB Part URL; ComponentLink2URL: https://jlcpcb.com/partdetail/C155006; ComponentLink3Description: LCSC Part URL; ComponentLink3URL: https://lcsc.com/product-detail/Inductors-SMD_TAI-TECH-TAI-TECH-FCI1608F-82NK_C155006.html
footprint IND-0603 (0603 (1608M) Inductor)
pins: 1, 2

## FCI1608F-100K
designator L?  Inductance: 10uH
Inductor, 10uH, ±10%, 2.55Ω, 15mA, SMD 0603; Manufacturer: TAI-TECH; Manufacturer Part Number: FCI1608F-100K; Package Size: 0603; JLCPCB Basic Part: No; JLCPCB Part Number: C127280; Supplier 1: LCSC; Category: Inductors; Supplier Part Number 1: C127280; Tolerance: ±10%; Rated Current: 15mA; DC Resistance: 2.55Ω; RoHS: Yes; ComponentLink1Description: Datasheet; ComponentLink1URL: https://wmsc.lcsc.com/wmsc/upload/file/pdf/v2/lcsc/2009171134_TAI-TECH-FCI1608F-100K_C127280.pdf; ComponentLink2Description: JLCPCB Part URL; ComponentLink2URL: https://jlcpcb.com/partdetail/C127280; ComponentLink3Description: LCSC Part URL; ComponentLink3URL: https://lcsc.com/product-detail/Inductors-SMD_TAI-TECH-TAI-TECH-FCI1608F-100K_C127280.html
footprint IND-0603 (0603 (1608M) Inductor)
pins: 1, 2

## FCI1608F-R10K
designator L?  Inductance: 100nH
Inductor, 100nH, ±10%, 500mΩ, 50mA, SMD 0603; Manufacturer: TAI-TECH; Manufacturer Part Number: FCI1608F-R10K; Package Size: 0603; JLCPCB Basic Part: No; JLCPCB Part Number: C155007; Supplier 1: LCSC; Category: Inductors; Supplier Part Number 1: C155007; Tolerance: ±10%; Rated Current: 50mA; DC Resistance: 500mΩ; RoHS: Yes; ComponentLink1Description: Datasheet; ComponentLink1URL: https://wmsc.lcsc.com/wmsc/upload/file/pdf/v2/lcsc/2009171305_TAI-TECH-FCI1608F-R10K_C155007.pdf; ComponentLink2Description: JLCPCB Part URL; ComponentLink2URL: https://jlcpcb.com/partdetail/C155007; ComponentLink3Description: LCSC Part URL; ComponentLink3URL: https://lcsc.com/product-detail/Inductors-SMD_TAI-TECH-TAI-TECH-FCI1608F-R10K_C155007.html
footprint IND-0603 (0603 (1608M) Inductor)
pins: 1, 2

## FCI1608F-R12K
designator L?  Inductance: 120nH
Inductor, 120nH, ±10%, 500mΩ, 50mA, SMD 0603; Manufacturer: TAI-TECH; Manufacturer Part Number: FCI1608F-R12K; Package Size: 0603; JLCPCB Basic Part: No; JLCPCB Part Number: C155008; Supplier 1: LCSC; Category: Inductors; Supplier Part Number 1: C155008; Tolerance: ±10%; Rated Current: 50mA; DC Resistance: 500mΩ; RoHS: Yes; ComponentLink1Description: Datasheet; ComponentLink1URL: https://wmsc.lcsc.com/wmsc/upload/file/pdf/v2/lcsc/2009171305_TAI-TECH-FCI1608F-R12K_C155008.pdf; ComponentLink2Description: JLCPCB Part URL; ComponentLink2URL: https://jlcpcb.com/partdetail/C155008; ComponentLink3Description: LCSC Part URL; ComponentLink3URL: https://lcsc.com/product-detail/Inductors-SMD_TAI-TECH-TAI-TECH-FCI1608F-R12K_C155008.html
footprint IND-0603 (0603 (1608M) Inductor)
pins: 1, 2

## FCI1608F-R15K
designator L?  Inductance: 150nH
Inductor, 150nH, ±10%, 600mΩ, 50mA, SMD 0603; Manufacturer: TAI-TECH; Manufacturer Part Number: FCI1608F-R15K; Package Size: 0603; JLCPCB Basic Part: No; JLCPCB Part Number: C155009; Supplier 1: LCSC; Category: Inductors; Supplier Part Number 1: C155009; Tolerance: ±10%; Rated Current: 50mA; DC Resistance: 600mΩ; RoHS: Yes; ComponentLink1Description: Datasheet; ComponentLink1URL: https://wmsc.lcsc.com/wmsc/upload/file/pdf/v2/lcsc/2009171305_TAI-TECH-FCI1608F-R15K_C155009.pdf; ComponentLink2Description: JLCPCB Part URL; ComponentLink2URL: https://jlcpcb.com/partdetail/C155009; ComponentLink3Description: LCSC Part URL; ComponentLink3URL: https://lcsc.com/product-detail/Inductors-SMD_TAI-TECH-TAI-TECH-FCI1608F-R15K_C155009.html
footprint IND-0603 (0603 (1608M) Inductor)
pins: 1, 2

## FCI1608F-R18K
designator L?  Inductance: 180nH
Inductor, 180nH, ±10%, 600mΩ, 50mA, SMD 0603; Manufacturer: TAI-TECH; Manufacturer Part Number: FCI1608F-R18K; Package Size: 0603; JLCPCB Basic Part: No; JLCPCB Part Number: C155010; Supplier 1: LCSC; Category: Inductors; Supplier Part Number 1: C155010; Tolerance: ±10%; Rated Current: 50mA; DC Resistance: 600mΩ; RoHS: Yes; ComponentLink1Description: Datasheet; ComponentLink1URL: https://wmsc.lcsc.com/wmsc/upload/file/pdf/v2/lcsc/2009171305_TAI-TECH-FCI1608F-R18K_C155010.pdf; ComponentLink2Description: JLCPCB Part URL; ComponentLink2URL: https://jlcpcb.com/partdetail/C155010; ComponentLink3Description: LCSC Part URL; ComponentLink3URL: https://lcsc.com/product-detail/Inductors-SMD_TAI-TECH-TAI-TECH-FCI1608F-R18K_C155010.html
footprint IND-0603 (0603 (1608M) Inductor)
pins: 1, 2

## FCI1608F-R22K
designator L?  Inductance: 220nH
Inductor, 220nH, ±10%, 800mΩ, 50mA, SMD 0603; Manufacturer: TAI-TECH; Manufacturer Part Number: FCI1608F-R22K; Package Size: 0603; JLCPCB Basic Part: No; JLCPCB Part Number: C155011; Supplier 1: LCSC; Category: Inductors; Supplier Part Number 1: C155011; Tolerance: ±10%; Rated Current: 50mA; DC Resistance: 800mΩ; RoHS: Yes; ComponentLink1Description: Datasheet; ComponentLink1URL: https://wmsc.lcsc.com/wmsc/upload/file/pdf/v2/lcsc/2009171305_TAI-TECH-FCI1608F-R22K_C155011.pdf; ComponentLink2Description: JLCPCB Part URL; ComponentLink2URL: https://jlcpcb.com/partdetail/C155011; ComponentLink3Description: LCSC Part URL; ComponentLink3URL: https://lcsc.com/product-detail/Inductors-SMD_TAI-TECH-TAI-TECH-FCI1608F-R22K_C155011.html
footprint IND-0603 (0603 (1608M) Inductor)
pins: 1, 2

## FCI1608F-R33K
designator L?  Inductance: 330nH
Inductor, 330nH, ±10%, 850mΩ, 35mA, SMD 0603; Manufacturer: TAI-TECH; Manufacturer Part Number: FCI1608F-R33K; Package Size: 0603; JLCPCB Basic Part: No; JLCPCB Part Number: C155013; Supplier 1: LCSC; Category: Inductors; Supplier Part Number 1: C155013; Tolerance: ±10%; Rated Current: 35mA; DC Resistance: 850mΩ; RoHS: Yes; ComponentLink1Description: Datasheet; ComponentLink1URL: https://wmsc.lcsc.com/wmsc/upload/file/pdf/v2/lcsc/2009171305_TAI-TECH-FCI1608F-R33K_C155013.pdf; ComponentLink2Description: JLCPCB Part URL; ComponentLink2URL: https://jlcpcb.com/partdetail/C155013; ComponentLink3Description: LCSC Part URL; ComponentLink3URL: https://lcsc.com/product-detail/Inductors-SMD_TAI-TECH-TAI-TECH-FCI1608F-R33K_C155013.html
footprint IND-0603 (0603 (1608M) Inductor)
pins: 1, 2
